# Altium footprint library 4.49-接插件.PcbLib: 260 footprints (part 10 of 17)
Each footprint in its own frame and in the unit in brackets; x right, y up, seen from the top. Pads: shape width x height; smd on the part's side, far side on the other; paste and mask are expansions set on the pad; w line width, h text height; cw(c..) or ccw(c..) is an arc to the next point about the centre after c.
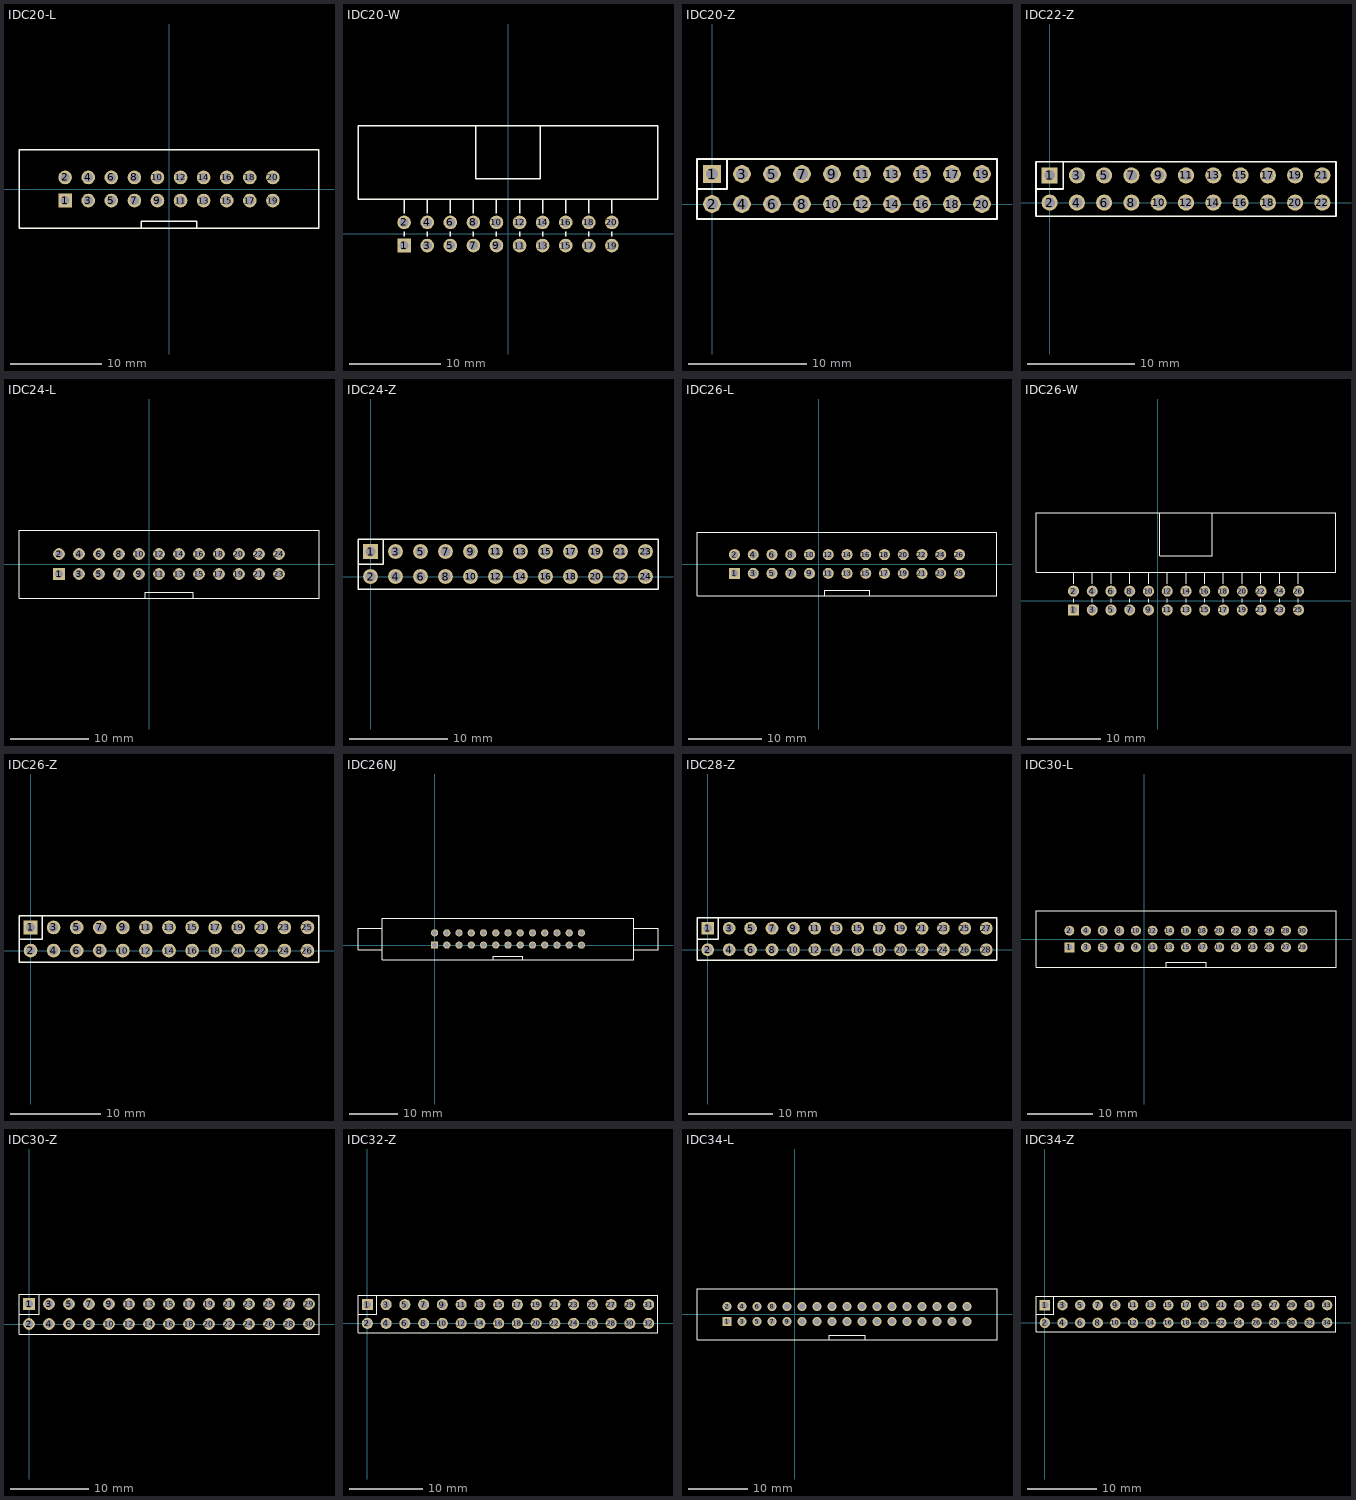
[diagram p9: the footprints below, top view; thin cyan lines are the x and y axes]

## IDC20-L [mm]
pads (20):
  rect 1.5x1.5 hole 1: 1(-11.43,-1.27)
  round 1.5 hole 1: 2(-11.43,1.27) 3(-8.89,-1.27) 4(-8.89,1.27) 5(-6.35,-1.27) 6(-6.35,1.27) 7(-3.81,-1.27) 8(-3.81,1.27) 9(-1.27,-1.27) 10(-1.27,1.27) 11(1.27,-1.27) 12(1.27,1.27) 13(3.81,-1.27) 14(3.81,1.27) 15(6.35,-1.27) 16(6.35,1.27) 17(8.89,-1.27) 18(8.89,1.27) 19(11.43,-1.27) 20(11.43,1.27)
Top Overlay:
  lines w0.15: -3.048,-4.318 -3.048,-3.556 3.048,-3.556 3.048,-4.318 ; -16.51,-4.318 16.51,-4.318 16.51,4.318 -16.51,4.318 -16.51,-4.318
3D body: height 8.75, standoff -3.1, extent -16.51,-4.55 16.51,4.55

## IDC20-W [mm]
pads (20):
  rect 1.5x1.5 hole 1: 1(-11.43,-1.27)
  round 1.5 hole 1: 2(-11.43,1.27) 3(-8.89,-1.27) 4(-8.89,1.27) 5(-6.35,-1.27) 6(-6.35,1.27) 7(-3.81,-1.27) 8(-3.81,1.27) 9(-1.27,-1.27) 10(-1.27,1.27) 11(1.27,-1.27) 12(1.27,1.27) 13(3.81,-1.27) 14(3.81,1.27) 15(6.35,-1.27) 16(6.35,1.27) 17(8.89,-1.27) 18(8.89,1.27) 19(11.43,-1.27) 20(11.43,1.27)
Top Overlay:
  lines w0.15: -16.51,7.112 -16.51,11.92 16.51,11.92 16.51,3.81 -16.51,3.81 -16.51,7.366 ; -11.43,-0.254 -11.43,0.254 ; -11.43,2.286 -11.43,3.81 ; -8.89,-0.254 -8.89,0.254 ; -8.89,2.286 -8.89,3.81 ; -6.35,-0.254 -6.35,0.254 ; -6.35,2.286 -6.35,3.81 ; -3.81,-0.254 -3.81,0.254 ; -3.81,2.286 -3.81,3.81 ; -3.556,11.92 -3.556,6.096 3.556,6.096 3.556,11.92 ; -1.27,-0.254 -1.27,0.254 ; -1.27,2.286 -1.27,3.556 -1.27,3.81 ; 1.27,-0.254 1.27,0.254 ; 1.27,2.286 1.27,3.81 ; 3.81,-0.254 3.81,0.254 ; 3.81,2.286 3.81,3.81 ; 6.35,-0.254 6.35,0.254 ; 6.35,2.286 6.35,3.81 ; 8.89,-0.254 8.89,0.254 ; 8.89,2.286 8.89,3.81 ; 11.43,-0.254 11.43,0.254 ; 11.43,2.286 11.43,3.81
3D body: height 9.11, standoff -3, extent -16.53,-1.587 16.53,12.273

## IDC20-Z [mm]
pads (20):
  rect 1.5x1.5 hole 1: 1(0,2.54)
  round 1.5 hole 1: 2(0,0) 3(2.54,2.54) 4(2.54,0) 5(5.08,2.54) 6(5.08,0) 7(7.62,2.54) 8(7.62,0) 9(10.16,2.54) 10(10.16,0) 11(12.7,2.54) 12(12.7,0) 13(15.24,2.54) 14(15.24,0) 15(17.78,2.54) 16(17.78,0) 17(20.32,2.54) 18(20.32,0) 19(22.86,2.54) 20(22.86,0)
Top Overlay:
  lines w0.15: -1.27,1.27 1.27,1.27 1.27,3.81 ; -1.27,-1.27 -1.27,3.81 24.13,3.81 24.13,-1.27 -1.27,-1.27
3D body: height 8.5, standoff -3.35, extent -1.27,-1.23 24.13,3.77

## IDC22-Z [mm]
pads (22):
  rect 1.5x1.5 hole 1: 1(0,2.54)
  round 1.5 hole 1: 2(0,0) 3(2.54,2.54) 4(2.54,0) 5(5.08,2.54) 6(5.08,0) 7(7.62,2.54) 8(7.62,0) 9(10.16,2.54) 10(10.16,0) 11(12.7,2.54) 12(12.7,0) 13(15.24,2.54) 14(15.24,0) 15(17.78,2.54) 16(17.78,0) 17(20.32,2.54) 18(20.32,0) 19(22.86,2.54) 20(22.86,0) 21(25.4,2.54) 22(25.4,0)
Top Overlay:
  lines w0.15: -1.27,1.27 1.27,1.27 1.27,3.81 ; -1.27,-1.27 -1.27,3.81 26.67,3.81 26.67,-1.27 -1.27,-1.27
3D body: height 8.5, standoff -3.35, extent -1.27,-1.23 26.67,3.77

## IDC24-L [mm]
pads (24):
  rect 1.5x1.5 hole 1: 1(-11.43,-1.27)
  round 1.5 hole 1: 2(-11.43,1.27) 3(-8.89,-1.27) 4(-8.89,1.27) 5(-6.35,-1.27) 6(-6.35,1.27) 7(-3.81,-1.27) 8(-3.81,1.27) 9(-1.27,-1.27) 10(-1.27,1.27) 11(1.27,-1.27) 12(1.27,1.27) 13(3.81,-1.27) 14(3.81,1.27) 15(6.35,-1.27) 16(6.35,1.27) 17(8.89,-1.27) 18(8.89,1.27) 19(11.43,-1.27) 20(11.43,1.27) 21(13.97,-1.27) 22(13.97,1.27) 23(16.51,-1.27) 24(16.51,1.27)
Top Overlay:
  lines w0.15: -0.508,-4.318 -0.508,-3.556 5.588,-3.556 5.588,-4.318 ; -16.51,-4.318 21.59,-4.318 21.59,4.318 -16.51,4.318 -16.51,-4.318
3D body: height 9.1, standoff -3.2, extent -16.51,-4.455 21.63,4.455

## IDC24-Z [mm]
pads (24):
  rect 1.5x1.5 hole 1: 1(0,2.54)
  round 1.5 hole 1: 2(0,0) 3(2.54,2.54) 4(2.54,0) 5(5.08,2.54) 6(5.08,0) 7(7.62,2.54) 8(7.62,0) 9(10.16,2.54) 10(10.16,0) 11(12.7,2.54) 12(12.7,0) 13(15.24,2.54) 14(15.24,0) 15(17.78,2.54) 16(17.78,0) 17(20.32,2.54) 18(20.32,0) 19(22.86,2.54) 20(22.86,0) 21(25.4,2.54) 22(25.4,0) 23(27.94,2.54) 24(27.94,0)
Top Overlay:
  lines w0.15: -1.27,1.27 1.27,1.27 1.27,3.81 ; -1.27,-1.27 -1.27,3.81 29.21,3.81 29.21,-1.27 -1.27,-1.27
3D body: height 8.5, standoff -3.35, extent -1.27,-1.23 29.21,3.77

## IDC26-L [mm]
pads (26):
  rect 1.5x1.5 hole 1: 1(-11.43,-1.27)
  round 1.5 hole 1: 2(-11.43,1.27) 3(-8.89,-1.27) 4(-8.89,1.27) 5(-6.35,-1.27) 6(-6.35,1.27) 7(-3.81,-1.27) 8(-3.81,1.27) 9(-1.27,-1.27) 10(-1.27,1.27) 11(1.27,-1.27) 12(1.27,1.27) 13(3.81,-1.27) 14(3.81,1.27) 15(6.35,-1.27) 16(6.35,1.27) 17(8.89,-1.27) 18(8.89,1.27) 19(11.43,-1.27) 20(11.43,1.27) 21(13.97,-1.27) 22(13.97,1.27) 23(16.51,-1.27) 24(16.51,1.27) 25(19.05,-1.27) 26(19.05,1.27)
Top Overlay:
  lines w0.15: 0.762,-4.318 0.762,-3.556 6.858,-3.556 6.858,-4.318 ; -16.51,-4.318 24.13,-4.318 24.13,4.318 -16.51,4.318 -16.51,-4.318
3D body: height 9.1, standoff -3.2, extent -16.51,-4.555 24.17,4.555

## IDC26-W [mm]
pads (26):
  rect 1.5x1.5 hole 1: 1(-11.43,-1.27)
  round 1.5 hole 1: 2(-11.43,1.27) 3(-8.89,-1.27) 4(-8.89,1.27) 5(-6.35,-1.27) 6(-6.35,1.27) 7(-3.81,-1.27) 8(-3.81,1.27) 9(-1.27,-1.27) 10(-1.27,1.27) 11(1.27,-1.27) 12(1.27,1.27) 13(3.81,-1.27) 14(3.81,1.27) 15(6.35,-1.27) 16(6.35,1.27) 17(8.89,-1.27) 18(8.89,1.27) 19(11.43,-1.27) 20(11.43,1.27) 21(13.97,-1.27) 22(13.97,1.27) 23(16.51,-1.27) 24(16.51,1.27) 25(19.05,-1.27) 26(19.05,1.27)
Top Overlay:
  lines w0.15: -16.51,7.112 -16.51,11.92 24.13,11.92 24.13,3.81 -16.51,3.81 -16.51,7.366 ; -11.43,-0.254 -11.43,0.254 ; -11.43,2.286 -11.43,3.81 ; -8.89,-0.254 -8.89,0.254 ; -8.89,2.286 -8.89,3.81 ; -6.35,-0.254 -6.35,0.254 ; -6.35,2.286 -6.35,3.81 ; -3.81,-0.254 -3.81,0.254 ; -3.81,2.286 -3.81,3.81 ; -1.27,-0.254 -1.27,0.254 ; -1.27,2.286 -1.27,3.556 -1.27,3.81 ; 0.254,11.92 0.254,6.096 7.366,6.096 7.366,11.92 ; 1.27,-0.254 1.27,0.254 ; 1.27,2.286 1.27,3.81 ; 3.81,-0.254 3.81,0.254 ; 3.81,2.286 3.81,3.81 ; 6.35,-0.254 6.35,0.254 ; 6.35,2.286 6.35,3.81 ; 8.89,-0.254 8.89,0.254 ; 8.89,2.286 8.89,3.81 ; 11.43,-0.254 11.43,0.254 ; 11.43,2.286 11.43,3.81 ; 13.97,-0.254 13.97,0.254 ; 13.97,2.286 13.97,3.81 ; 16.51,-0.254 16.51,0.254 ; 16.51,2.286 16.51,3.81 ; 19.05,-0.254 19.05,0.254 ; 19.05,2.286 19.05,3.81
3D body: height 9.11, standoff -3, extent -16.53,-1.587 24.15,12.273

## IDC26-Z [mm]
pads (26):
  rect 1.5x1.5 hole 1: 1(0,2.54)
  round 1.5 hole 1: 2(0,0) 3(2.54,2.54) 4(2.54,0) 5(5.08,2.54) 6(5.08,0) 7(7.62,2.54) 8(7.62,0) 9(10.16,2.54) 10(10.16,0) 11(12.7,2.54) 12(12.7,0) 13(15.24,2.54) 14(15.24,0) 15(17.78,2.54) 16(17.78,0) 17(20.32,2.54) 18(20.32,0) 19(22.86,2.54) 20(22.86,0) 21(25.4,2.54) 22(25.4,0) 23(27.94,2.54) 24(27.94,0) 25(30.48,2.54) 26(30.48,0)
Top Overlay:
  lines w0.15: -1.27,1.27 1.27,1.27 1.27,3.81 ; -1.27,-1.27 -1.27,3.81 31.75,3.81 31.75,-1.27 -1.27,-1.27
3D body: height 8.5, standoff -3.35, extent -1.27,-1.23 31.75,3.77

## IDC26NJ [mm]
pads (26):
  rect 1.5x1.5 hole 1: 1(0,0)
  round 1.5 hole 1: 2(0,2.54) 3(2.54,0) 4(2.54,2.54) 5(5.08,0) 6(5.08,2.54) 7(7.62,0) 8(7.62,2.54) 9(10.16,0) 10(10.16,2.54) 11(12.7,0) 12(12.7,2.54) 13(15.24,0) 14(15.24,2.54) 15(17.78,0) 16(17.78,2.54) 17(20.32,0) 18(20.32,2.54) 19(22.86,0) 20(22.86,2.54) 21(25.4,0) 22(25.4,2.54) 23(27.94,0) 24(27.94,2.54) 25(30.48,0) 26(30.48,2.54)
Top Overlay:
  lines w0.1: -15.9,-0.96 -15.9,3.5 -10.9,3.5 -10.9,-0.96 ; 41.38,-0.96 41.38,3.5 46.38,3.5 46.38,-0.96
  lines w0.15: -15.9,-0.96 -10.9,-0.96 -10.9,-3.048 41.38,-3.048 41.38,-0.96 46.38,-0.96 ; -10.9,3.5 -10.9,5.588 ; -10.887,5.588 41.38,5.588 41.38,3.5 ; 12.192,-3.048 12.192,-2.286 18.288,-2.286 18.288,-3.048
3D body: height 26.9, standoff -2.74, extent -10.941,-2.921 41.434,5.461

## IDC28-Z [mm]
pads (28):
  rect 1.5x1.5 hole 1: 1(0,2.54)
  round 1.5 hole 1: 2(0,0) 3(2.54,2.54) 4(2.54,0) 5(5.08,2.54) 6(5.08,0) 7(7.62,2.54) 8(7.62,0) 9(10.16,2.54) 10(10.16,0) 11(12.7,2.54) 12(12.7,0) 13(15.24,2.54) 14(15.24,0) 15(17.78,2.54) 16(17.78,0) 17(20.32,2.54) 18(20.32,0) 19(22.86,2.54) 20(22.86,0) 21(25.4,2.54) 22(25.4,0) 23(27.94,2.54) 24(27.94,0) 25(30.48,2.54) 26(30.48,0) 27(33.02,2.54) 28(33.02,0)
Top Overlay:
  lines w0.15: -1.27,1.27 1.27,1.27 1.27,3.81 ; -1.27,-1.27 -1.27,3.81 34.29,3.81 34.29,-1.27 -1.27,-1.27
3D body: height 8.5, standoff -3.35, extent -1.27,-1.23 34.29,3.77

## IDC30-L [mm]
pads (30):
  rect 1.5x1.5 hole 1: 1(-11.43,-1.27)
  round 1.5 hole 1: 2(-11.43,1.27) 3(-8.89,-1.27) 4(-8.89,1.27) 5(-6.35,-1.27) 6(-6.35,1.27) 7(-3.81,-1.27) 8(-3.81,1.27) 9(-1.27,-1.27) 10(-1.27,1.27) 11(1.27,-1.27) 12(1.27,1.27) 13(3.81,-1.27) 14(3.81,1.27) 15(6.35,-1.27) 16(6.35,1.27) 17(8.89,-1.27) 18(8.89,1.27) 19(11.43,-1.27) 20(11.43,1.27) 21(13.97,-1.27) 22(13.97,1.27) 23(16.51,-1.27) 24(16.51,1.27) 25(19.05,-1.27) 26(19.05,1.27) 27(21.59,-1.27) 28(21.59,1.27) 29(24.13,-1.27) 30(24.13,1.27)
Top Overlay:
  lines w0.15: 3.302,-4.318 3.302,-3.556 9.398,-3.556 9.398,-4.318 ; -16.51,-4.318 29.21,-4.318 29.21,4.318 -16.51,4.318 -16.51,-4.318
3D body: height 9.1, standoff -3.2, extent -16.51,-4.555 29.25,4.555

## IDC30-Z [mm]
pads (30):
  rect 1.5x1.5 hole 1: 1(0,2.54)
  round 1.5 hole 1: 2(0,0) 3(2.54,2.54) 4(2.54,0) 5(5.08,2.54) 6(5.08,0) 7(7.62,2.54) 8(7.62,0) 9(10.16,2.54) 10(10.16,0) 11(12.7,2.54) 12(12.7,0) 13(15.24,2.54) 14(15.24,0) 15(17.78,2.54) 16(17.78,0) 17(20.32,2.54) 18(20.32,0) 19(22.86,2.54) 20(22.86,0) 21(25.4,2.54) 22(25.4,0) 23(27.94,2.54) 24(27.94,0) 25(30.48,2.54) 26(30.48,0) 27(33.02,2.54) 28(33.02,0) 29(35.56,2.54) 30(35.56,0)
Top Overlay:
  lines w0.15: -1.27,1.27 1.27,1.27 1.27,3.81 ; -1.27,-1.27 -1.27,3.81 36.83,3.81 36.83,-1.27 -1.27,-1.27
3D body: height 8.5, standoff -3.35, extent -1.27,-1.23 36.83,3.77

## IDC32-Z [mm]
pads (32):
  rect 1.5x1.5 hole 1: 1(0,2.54)
  round 1.5 hole 1: 2(0,0) 3(2.54,2.54) 4(2.54,0) 5(5.08,2.54) 6(5.08,0) 7(7.62,2.54) 8(7.62,0) 9(10.16,2.54) 10(10.16,0) 11(12.7,2.54) 12(12.7,0) 13(15.24,2.54) 14(15.24,0) 15(17.78,2.54) 16(17.78,0) 17(20.32,2.54) 18(20.32,0) 19(22.86,2.54) 20(22.86,0) 21(25.4,2.54) 22(25.4,0) 23(27.94,2.54) 24(27.94,0) 25(30.48,2.54) 26(30.48,0) 27(33.02,2.54) 28(33.02,0) 29(35.56,2.54) 30(35.56,0) 31(38.1,2.54) 32(38.1,0)
Top Overlay:
  lines w0.15: -1.27,1.27 1.27,1.27 1.27,3.81 ; -1.27,-1.27 39.37,-1.27 39.37,3.81 -1.27,3.81 -1.27,-1.27
3D body: height 8.5, standoff -3.35, extent -1.27,-1.23 39.37,3.77

## IDC34-L [mm]
pads (34):
  rect 1.5x1.5 hole 1: 1(-11.43,-1.27)
  round 1.5 hole 1: 2(-11.43,1.27) 3(-8.89,-1.27) 4(-8.89,1.27) 5(-6.35,-1.27) 6(-6.35,1.27) 7(-3.81,-1.27) 8(-3.81,1.27) 9(-1.27,-1.27) 10(-1.27,1.27) 11(1.27,-1.27) 12(1.27,1.27) 13(3.81,-1.27) 14(3.81,1.27) 15(6.35,-1.27) 16(6.35,1.27) 17(8.89,-1.27) 18(8.89,1.27) 19(11.43,-1.27) 20(11.43,1.27) 21(13.97,-1.27) 22(13.97,1.27) 23(16.51,-1.27) 24(16.51,1.27) 25(19.05,-1.27) 26(19.05,1.27) 27(21.59,-1.27) 28(21.59,1.27) 29(24.13,-1.27) 30(24.13,1.27) 31(26.67,-1.27) 32(26.67,1.27) 33(29.21,-1.27) 34(29.21,1.27)
Top Overlay:
  lines w0.15: 5.842,-4.318 5.842,-3.556 11.938,-3.556 11.938,-4.318 ; -16.51,-4.318 -16.51,4.318 34.29,4.318 34.29,-4.318 -16.51,-4.318
3D body: height 9.1, standoff -3.2, extent -16.51,-4.555 34.33,4.555

## IDC34-Z [mm]
pads (34):
  rect 1.5x1.5 hole 1: 1(0,2.54)
  round 1.5 hole 1: 2(0,0) 3(2.54,2.54) 4(2.54,0) 5(5.08,2.54) 6(5.08,0) 7(7.62,2.54) 8(7.62,0) 9(10.16,2.54) 10(10.16,0) 11(12.7,2.54) 12(12.7,0) 13(15.24,2.54) 14(15.24,0) 15(17.78,2.54) 16(17.78,0) 17(20.32,2.54) 18(20.32,0) 19(22.86,2.54) 20(22.86,0) 21(25.4,2.54) 22(25.4,0) 23(27.94,2.54) 24(27.94,0) 25(30.48,2.54) 26(30.48,0) 27(33.02,2.54) 28(33.02,0) 29(35.56,2.54) 30(35.56,0) 31(38.1,2.54) 32(38.1,0) 33(40.64,2.54) 34(40.64,0)
Top Overlay:
  lines w0.15: -1.27,1.27 1.27,1.27 1.27,3.81 ; -1.27,-1.27 -1.27,3.81 41.91,3.81 41.91,-1.27 -1.27,-1.27
3D body: height 8.5, standoff -3.35, extent -1.27,-1.23 41.91,3.77